# Altium footprint library SOURIAU THD.PcbLib: 34 footprints (part 2 of 5)
Each footprint in its own frame and in the unit in brackets; x right, y up, seen from the top. Pads: shape width x height; smd on the part's side, far side on the other; paste and mask are expansions set on the pad; w line width, h text height; cw(c..) or ccw(c..) is an arc to the next point about the centre after c.
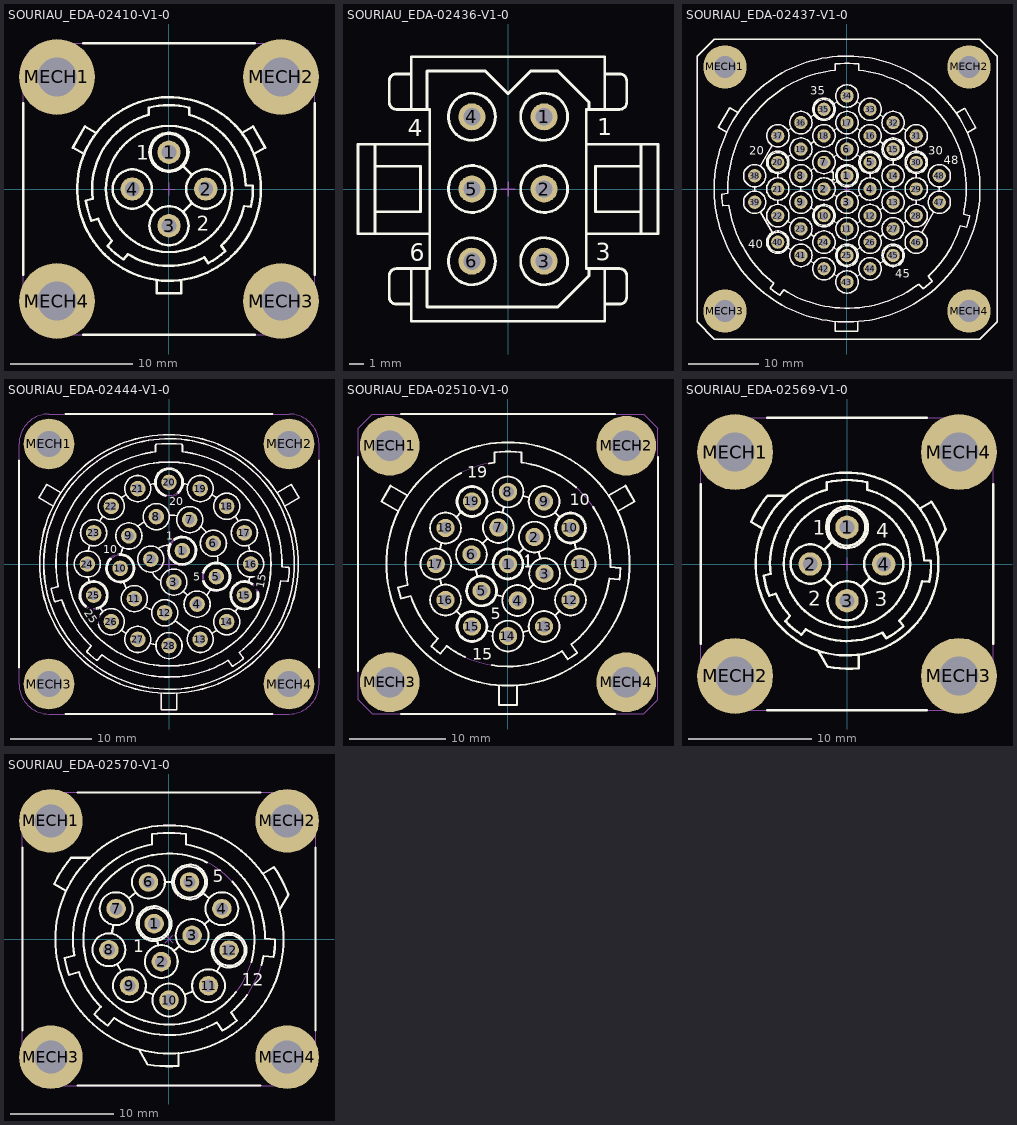
[diagram p1: the footprints below, top view; thin cyan lines are the x and y axes]

## SOURIAU_EDA-02410-V1-0 [mm] "Adapter Kit For PCB Mount For SOURIAU UTO0104P21T, 4 Poles, Shell Size 10, UT Bantam Circular Male Connector. UTO Series"
height 33.3
pads (8):
  round 1.9 hole 1.2: 1(0,3) 2(3,0) 3(0,-3) 4(-3,0)
  round 6.2 hole 3.2: MECH1(-9.15,9.15) MECH2(9.15,9.15) MECH3(9.15,-9.15) MECH4(-9.15,-9.15)
Top Overlay:
  circle w0.2: c0,3 r1.6
  circle w0.2: c0,3 r1.5
  circle w0.2: c-3,0 r1.6
  circle w0.2: c0,-3 r1.6
  circle w0.2: c3,0 r1.6
  circle w0.2: c0,0 r5.15
  circle w0.2: c0,0 r7.5
  lines w0.2: -11.9,-6.985 -11.9,6.985 ; -6.985,-11.9 6.985,-11.9 ; -6.985,11.9 6.985,11.9 ; -6.937,2.85 -7.861,3.384 -6.861,5.116 -5.937,4.583 ; -1.869,-1.131 -1.131,-1.869 ; -1,-7.433 -1,-8.5 1,-8.5 1,-7.433 ; 1.131,-1.869 1.869,-1.131 ; 1.131,1.869 1.869,1.131 ; 5.937,4.583 6.861,5.116 7.861,3.384 6.937,2.85 ; 11.9,-6.985 11.9,6.985 ; -6.785,-0.938 ccw(c0,0) -6.345,-2.58 -5.795,-2.433 ccw(c0,0) -4.654,-4.224 -5.02,-4.66 ccw(c0,0) -3.718,-5.753 -3.352,-5.317 ccw(c0,0) 2.876,-5.589 3.202,-6.055 ccw(c0,0) 4.595,-5.08 4.268,-4.614 ccw(c0,0) 6.13,-1.39 6.697,-1.439 ccw(c0,0) 6.845,0.254 6.278,0.304 ccw(c0,0) 1.65,6.065 1.65,6.648 ccw(c0,0) -1.65,6.648 -1.65,6.065 ccw(c0,0) -6.235,-0.791 -6.785,-0.938
  text "1" at -2.675,2.4 h1.2
  text "2" at 2.273,-3.412 h1.2
Mechanical 8:
  lines w0.1: -9.65,-9.15 -9.15,-9.15 ; -9.65,9.15 -9.15,9.15 ; -9.15,-9.65 -9.15,-9.15 ; -9.15,-8.65 -9.15,-9.15 ; -9.15,8.65 -9.15,9.15 ; -9.15,9.65 -9.15,9.15 ; -8.65,-9.15 -9.15,-9.15 ; -8.65,9.15 -9.15,9.15 ; -3.5,0 -3,0 ; -3,-0.5 -3,0 ; -3,0.5 -3,0 ; -2.5,0 -3,0 ; -0.5,-3 0,-3 ; -0.5,0 0,0 ; -0.5,3 0,3 ; 0,-3.5 0,-3 ; 0,-2.5 0,-3 ; 0,-0.5 0,0 ; 0,0.5 0,0 ; 0,2.5 0,3 ; 0,3.5 0,3 ; 0.5,-3 0,-3 ; 0.5,0 0,0 ; 0.5,3 0,3 ; 2.5,0 3,0 ; 3,-0.5 3,0 ; 3,0.5 3,0 ; 3.5,0 3,0 ; 8.65,-9.15 9.15,-9.15 ; 8.65,9.15 9.15,9.15 ; 9.15,-9.65 9.15,-9.15 ; 9.15,-8.65 9.15,-9.15 ; 9.15,8.65 9.15,9.15 ; 9.15,9.65 9.15,9.15 ; 9.65,-9.15 9.15,-9.15 ; 9.65,9.15 9.15,9.15
Mechanical 14:
  circle w0.1: c0,3 r1.6
  circle w0.1: c-3,0 r1.6
  circle w0.1: c0,-3 r1.6
  circle w0.1: c3,0 r1.6
  circle w0.1: c0,0 r5.15
  circle w0.1: c0,0 r7.5
  circle w0.1: c-9.15,9.15 r2.8
  circle w0.1: c9.15,9.15 r2.8
  circle w0.1: c9.15,-9.15 r2.8
  circle w0.1: c-9.15,-9.15 r2.8
  lines w0.1: -6.937,2.85 -7.861,3.384 -6.861,5.116 -5.937,4.583 ; -1.869,-1.131 -1.131,-1.869 ; -1,-7.433 -1,-8.5 1,-8.5 1,-7.433 ; 1.131,-1.869 1.869,-1.131 ; 1.131,1.869 1.869,1.131 ; 5.937,4.583 6.861,5.116 7.861,3.384 6.937,2.85 ; -11.9,-9.9 ccw(c-9.9,-9.9) -9.9,-11.9 9.9,-11.9 ccw(c9.9,-9.9) 11.9,-9.9 11.9,9.9 ccw(c9.9,9.9) 9.9,11.9 -9.9,11.9 ccw(c-9.9,9.9) -11.9,9.9 -11.9,-9.9 ; -10.312,-9.506 ccw(c-10.648,-9.15) -10.312,-8.794 cw(c-10.12,-8.59) -10.04,-8.322 ccw(c-9.899,-7.852) -9.422,-7.965 cw(c-9.15,-8.03) -8.878,-7.965 ccw(c-8.401,-7.852) -8.26,-8.322 cw(c-8.18,-8.59) -7.988,-8.794 ccw(c-7.652,-9.15) -7.988,-9.506 cw(c-8.18,-9.71) -8.26,-9.978 ccw(c-8.401,-10.448) -8.878,-10.335 cw(c-9.15,-10.27) -9.422,-10.335 ccw(c-9.899,-10.448) -10.04,-9.978 cw(c-10.12,-9.71) -10.312,-9.506 ; -10.312,8.794 ccw(c-10.648,9.15) -10.312,9.506 cw(c-10.12,9.71) -10.04,9.978 ccw(c-9.899,10.448) -9.422,10.335 cw(c-9.15,10.27) -8.878,10.335 ccw(c-8.401,10.448) -8.26,9.978 cw(c-8.18,9.71) -7.988,9.506 ccw(c-7.652,9.15) -7.988,8.794 cw(c-8.18,8.59) -8.26,8.322 ccw(c-8.401,7.852) -8.878,7.965 cw(c-9.15,8.03) -9.422,7.965 ccw(c-9.899,7.852) -10.04,8.322 cw(c-10.12,8.59) -10.312,8.794 ; -6.785,-0.938 ccw(c0,0) -6.345,-2.58 -5.795,-2.433 ccw(c0,0) -4.654,-4.224 -5.02,-4.66 ccw(c0,0) -3.718,-5.753 -3.352,-5.317 ccw(c0,0) 2.876,-5.589 3.202,-6.055 ccw(c0,0) 4.595,-5.08 4.268,-4.614 ccw(c0,0) 6.13,-1.39 6.697,-1.439 ccw(c0,0) 6.845,0.254 6.278,0.304 ccw(c0,0) 1.65,6.065 1.65,6.648 ccw(c0,0) -1.65,6.648 -1.65,6.065 ccw(c0,0) -6.235,-0.791 -6.785,-0.938 ; 7.988,-9.506 ccw(c7.652,-9.15) 7.988,-8.794 cw(c8.18,-8.59) 8.26,-8.322 ccw(c8.401,-7.852) 8.878,-7.965 cw(c9.15,-8.03) 9.422,-7.965 ccw(c9.899,-7.852) 10.04,-8.322 cw(c10.12,-8.59) 10.312,-8.794 ccw(c10.648,-9.15) 10.312,-9.506 cw(c10.12,-9.71) 10.04,-9.978 ccw(c9.899,-10.448) 9.422,-10.335 cw(c9.15,-10.27) 8.878,-10.335 ccw(c8.401,-10.448) 8.26,-9.978 cw(c8.18,-9.71) 7.988,-9.506 ; 7.988,8.794 ccw(c7.652,9.15) 7.988,9.506 cw(c8.18,9.71) 8.26,9.978 ccw(c8.401,10.448) 8.878,10.335 cw(c9.15,10.27) 9.422,10.335 ccw(c9.899,10.448) 10.04,9.978 cw(c10.12,9.71) 10.312,9.506 ccw(c10.648,9.15) 10.312,8.794 cw(c10.12,8.59) 10.04,8.322 ccw(c9.899,7.852) 9.422,7.965 cw(c9.15,8.03) 8.878,7.965 ccw(c8.401,7.852) 8.26,8.322 cw(c8.18,8.59) 7.988,8.794
  text "1" at -0.143,2.4 h1.2
  text "2" at 2.6,-0.6 h1.2
  text "3" at -0.4,-3.6 h1.2
  text "4" at -3.429,-0.6 h1.2
3D body "SOURIAU_EDA-02410-V1-0.stp": height 33.3, standoff -14.2, extent -12.25,-12.243 12.25,12.244

## SOURIAU_EDA-02436-V1-0 [mm] "SOURIAU SMS6P1 Adapter Kit For PCB Mount, 6 Poles Qikmate Male Connectors (Cable plug without strain relief hood)"
height 32.9
pads (6):
  round 1.9 hole 1.2: 1(2.54,5.08) 2(2.54,0) 3(2.54,-5.08) 4(-2.54,5.08) 5(-2.54,0) 6(-2.54,-5.08)
Top Overlay:
  circle w0.2: c-2.54,5.08 r1.65
  circle w0.2: c2.54,5.08 r1.65
  circle w0.2: c2.54,0 r1.65
  circle w0.2: c-2.54,0 r1.65
  circle w0.2: c-2.54,-5.08 r1.65
  circle w0.2: c2.54,-5.08 r1.65
  lines w0.2: -9.35,-3.15 -9.35,3.15 ; -9.35,-1.6 -7.35,-1.6 -6.15,-1.6 -6.15,1.6 -7.35,1.6 -9.35,1.6 ; -6.8,-8.1 -7.85,-8.1 cw(c-7.85,-7.6) -8.35,-7.6 -8.35,-6.1 cw(c-7.85,-6.1) -7.85,-5.6 -5.5,-5.6 -5.5,5.6 -7.85,5.6 cw(c-7.85,6.1) -8.35,6.1 -8.35,7.6 cw(c-7.85,7.6) -7.85,8.1 -6.8,8.1 ; -6.8,-5.6 -6.8,-9.3 6.8,-9.3 6.8,-5.6 ; -6.8,5.6 -6.8,9.3 6.8,9.3 6.8,5.6 ; -5.7,-5.6 -5.7,-8.3 3.5,-8.3 5.7,-6.1 5.7,-5.6 ; -5.7,5.6 -5.7,8.3 -1.6,8.3 0,6.7 1.6,8.3 3.5,8.3 5.7,6.1 5.7,5.6 ; -5.5,-3.15 -10.55,-3.15 -10.55,3.15 -5.5,3.15 ; 5.5,-3.15 10.55,-3.15 10.55,3.15 5.5,3.15 ; 6.8,-8.1 7.85,-8.1 ccw(c7.85,-7.6) 8.35,-7.6 8.35,-6.1 ccw(c7.85,-6.1) 7.85,-5.6 5.5,-5.6 5.5,5.6 7.85,5.6 ccw(c7.85,6.1) 8.35,6.1 8.35,7.6 ccw(c7.85,7.6) 7.85,8.1 6.8,8.1 ; 7.351,1.6 6.15,1.6 6.15,-1.6 9.35,-1.6 ; 7.357,1.6 9.35,1.6 ; 9.35,-3.15 9.35,3.15
  text "3" at 6.182,-4.999 h1.2
  text "6" at -6.909,-5.043 h1.2
  text "1" at 6.289,3.778 h1.2
  text "4" at -7.039,3.693 h1.2
Mechanical 8:
  lines w0.1: -3.04,-5.08 -2.54,-5.08 ; -3.04,0 -2.54,0 ; -3.04,5.08 -2.54,5.08 ; -2.54,-5.58 -2.54,-5.08 ; -2.54,-4.58 -2.54,-5.08 ; -2.54,-0.5 -2.54,0 ; -2.54,0.5 -2.54,0 ; -2.54,4.58 -2.54,5.08 ; -2.54,5.58 -2.54,5.08 ; -2.04,-5.08 -2.54,-5.08 ; -2.04,0 -2.54,0 ; -2.04,5.08 -2.54,5.08 ; -0.5,0 0,0 ; 0,-0.5 0,0 ; 0,0.5 0,0 ; 0.5,0 0,0 ; 2.04,-5.08 2.54,-5.08 ; 2.04,0 2.54,0 ; 2.04,5.08 2.54,5.08 ; 2.54,-5.58 2.54,-5.08 ; 2.54,-4.58 2.54,-5.08 ; 2.54,-0.5 2.54,0 ; 2.54,0.5 2.54,0 ; 2.54,4.58 2.54,5.08 ; 2.54,5.58 2.54,5.08 ; 3.04,-5.08 2.54,-5.08 ; 3.04,0 2.54,0 ; 3.04,5.08 2.54,5.08
Mechanical 14:
  circle w0.1: c-2.54,5.08 r1.65
  circle w0.1: c2.54,5.08 r1.65
  circle w0.1: c2.54,0 r1.65
  circle w0.1: c-2.54,0 r1.65
  circle w0.1: c-2.54,-5.08 r1.65
  circle w0.1: c2.54,-5.08 r1.65
  lines w0.1: -9.35,-3.15 -9.35,3.15 ; -9.35,-1.6 -7.35,-1.6 -6.15,-1.6 -6.15,1.6 -7.35,1.6 -9.35,1.6 ; -6.8,-8.1 -7.85,-8.1 cw(c-7.85,-7.6) -8.35,-7.6 -8.35,-6.1 cw(c-7.85,-6.1) -7.85,-5.6 -5.5,-5.6 -5.5,5.6 -7.85,5.6 cw(c-7.85,6.1) -8.35,6.1 -8.35,7.6 cw(c-7.85,7.6) -7.85,8.1 -6.8,8.1 ; -6.8,-5.6 -6.8,-9.3 6.8,-9.3 6.8,-5.6 ; -6.8,5.6 -6.8,9.3 6.8,9.3 6.8,5.6 ; -5.7,-5.6 -5.7,-8.3 3.5,-8.3 5.7,-6.1 5.7,-5.6 ; -5.7,5.6 -5.7,8.3 -1.6,8.3 0,6.7 1.6,8.3 3.5,8.3 5.7,6.1 5.7,5.6 ; -5.5,-3.15 -10.55,-3.15 -10.55,3.15 -5.5,3.15 ; 5.5,-3.15 10.55,-3.15 10.55,3.15 5.5,3.15 ; 6.8,-8.1 7.85,-8.1 ccw(c7.85,-7.6) 8.35,-7.6 8.35,-6.1 ccw(c7.85,-6.1) 7.85,-5.6 5.5,-5.6 5.5,5.6 7.85,5.6 ccw(c7.85,6.1) 8.35,6.1 8.35,7.6 ccw(c7.85,7.6) 7.85,8.1 6.8,8.1 ; 7.351,1.6 6.15,1.6 6.15,-1.6 9.35,-1.6 ; 7.357,1.6 9.35,1.6 ; 9.35,-3.15 9.35,3.15
  text "1" at 2.397,4.48 h1.2
  text "4" at -2.969,4.48 h1.2
  text "5" at -2.94,-0.6 h1.2
  text "2" at 2.14,-0.6 h1.2
  text "6" at -2.911,-5.68 h1.2
3D body "SOURIAU_EDA-02436-V1-0.stp": height 33.2, standoff -13, extent -10.55,-9.3 10.55,9.3

## SOURIAU_EDA-02437-V1-0 [mm] "Adapter Kit For PCB Mount For SOURIAU UTO02448P21T, 48 Poles, Shell Size 24, UT Bantam Circular Female Connector. UTO Series"
height 38.1
pads (52):
  round 1.9 hole 1.2: 1(0,1.9) 2(-3.3,0) 3(0,-1.9) 4(3.3,0) 5(3.3,3.8) 6(0,5.7) 7(-3.3,3.8) 8(-6.6,1.883) 9(-6.6,-1.9) 10(-3.3,-3.8) 11(0,-5.7) 12(3.3,-3.8) 13(6.6,-1.9) 14(6.6,1.9) 15(6.6,5.7) 16(3.3,7.6) 17(0,9.5) 18(-3.3,7.6) 19(-6.6,5.7) 20(-9.9,3.8) 21(-9.9,0) 22(-9.9,-3.8) 23(-6.6,-5.7) 24(-3.3,-7.6) 25(0,-9.5) 26(3.3,-7.6) 27(6.6,-5.7) 28(9.9,-3.8) 29(9.9,0) 30(9.9,3.8) 31(9.9,7.6) 32(6.6,9.5) 33(3.3,11.4) 34(0,13.3) 35(-3.3,11.4) 36(-6.6,9.5) 37(-9.9,7.6) 38(-13.2,1.9) 39(-13.2,-1.9) 40(-9.9,-7.6) 41(-6.6,-9.5) 42(-3.3,-11.4) 43(0,-13.3) 44(3.3,-11.4) 45(6.6,-9.5) 46(9.9,-7.617) 47(13.2,-1.9) 48(13.2,1.9)
  round 6.2 hole 3.2: MECH1(-17.45,17.45) MECH2(17.45,17.45) MECH3(-17.45,-17.45) MECH4(17.45,-17.45)
Top Overlay:
  circle w0.2: c0,0 r19.015
  circle w0.2: c9.9,3.8 r1.6
  circle w0.2: c0,1.9 r1.6
  circle w0.2: c-9.9,3.8 r1.6
  circle w0.2: c6.6,-9.5 r1.6
  circle w0.2: c-9.9,3.8 r1.4
  circle w0.2: c0,1.9 r1.4
  circle w0.2: c9.9,3.8 r1.4
  circle w0.2: c6.6,-9.5 r1.4
  circle w0.2: c0,5.7 r1.6
  circle w0.2: c3.3,0 r1.6
  circle w0.2: c0,-1.9 r1.6
  circle w0.2: c-3.3,0 r1.6
  circle w0.2: c-6.6,1.883 r1.6
  circle w0.2: c-6.6,-1.9 r1.6
  circle w0.2: c0,-5.7 r1.6
  circle w0.2: c6.6,-1.9 r1.6
  circle w0.2: c9.9,7.6 r1.6
  circle w0.2: c6.6,9.5 r1.6
  circle w0.2: c0,13.3 r1.6
  circle w0.2: c-6.6,9.5 r1.6
  circle w0.2: c-9.891,7.616 r1.6
  circle w0.2: c-13.2,-1.9 r1.6
  circle w0.2: c6.6,-9.5 r1.6
  circle w0.2: c-3.3,-11.4 r1.6
  circle w0.2: c0,-13.3 r1.6
  circle w0.2: c3.3,-11.4 r1.6
  circle w0.2: c3.3,-7.6 r1.6
  circle w0.2: c6.6,-5.7 r1.6
  circle w0.2: c9.9,-3.8 r1.6
  circle w0.2: c13.2,-1.9 r1.6
  circle w0.2: c9.9,0 r1.6
  circle w0.2: c6.6,1.9 r1.6
  circle w0.2: c13.2,1.9 r1.6
  circle w0.2: c9.9,7.6 r1.6
  circle w0.2: c-3.3,7.6 r1.6
  circle w0.2: c0,9.5 r1.6
  circle w0.2: c3.3,7.6 r1.6
  circle w0.2: c-6.6,-5.7 r1.6
  circle w0.2: c-3.3,-7.6 r1.6
  circle w0.2: c-9.9,-3.8 r1.6
  circle w0.2: c-9.9,0 r1.6
  circle w0.2: c-3.3,3.8 r1.6
  circle w0.2: c3.3,3.8 r1.6
  circle w0.2: c3.3,3.8 r1.4
  circle w0.2: c-3.3,-3.8 r1.6
  circle w0.2: c-3.3,-3.8 r1.4
  circle w0.2: c9.9,-7.617 r1.6
  circle w0.2: c6.6,5.7 r1.6
  circle w0.2: c6.6,5.7 r1.4
  circle w0.2: c-6.6,5.7 r1.6
  circle w0.2: c-13.2,1.9 r1.6
  circle w0.2: c-9.9,-7.6 r1.6
  circle w0.2: c-9.9,-7.6 r1.4
  circle w0.2: c-9.9,-7.6 r1.6
  circle w0.2: c-6.6,-9.5 r1.6
  circle w0.2: c3.3,-3.8 r1.6
  circle w0.2: c0,-9.5 r1.6
  circle w0.2: c0,-9.5 r1.4
  circle w0.2: c0,-9.5 r1.6
  circle w0.2: c3.3,11.4 r1.6
  circle w0.2: c-3.3,11.4 r1.6
  circle w0.2: c-3.3,11.4 r1.4
  lines w0.2: -17.187,8.134 -18.394,8.831 -16.794,11.602 -15.58,10.901 ; -13.2,-0.3 -13.2,0.3 ; -12.398,-3.285 -10.702,-6.215 ; -12.398,3.285 -10.693,6.231 ; -9.9,-2.2 -9.9,-1.6 ; -9.9,1.6 -9.9,2.2 ; -8.513,-8.398 -7.987,-8.702 ; -8.513,-4.598 -7.987,-4.902 ; -8.513,4.598 -7.987,4.902 ; -8.5,8.406 -7.987,8.702 ; -6.6,-0.3 -6.6,0.283 ; -5.216,2.687 -4.684,2.996 ; -5.213,-10.298 -4.687,-10.602 ; -5.213,-6.498 -4.687,-6.802 ; -5.213,-2.698 -4.687,-3.002 ; -5.213,6.498 -4.687,6.802 ; -5.213,10.298 -4.687,10.602 ; -2.177,1.3 -1.775,1.3 ; -2.177,2.3 -1.975,2.5 -1.975,1.3 ; -1.913,-12.198 -1.387,-12.502 ; -1.913,-8.398 -1.387,-8.702 ; -1.913,-4.598 -1.387,-4.902 ; -1.913,-0.798 -1.387,-1.102 ; -1.913,0.798 -1.387,1.102 ; -1.913,4.598 -1.387,4.902 ; -1.913,8.398 -1.387,8.702 ; -1.913,12.198 -1.387,12.502 ; -1.651,-18.943 -1.651,-20.345 1.549,-20.345 1.549,-18.952 ; 1.387,-12.502 1.913,-12.198 ; 1.387,-8.702 1.913,-8.398 ; 1.387,-4.902 1.913,-4.598 ; 1.387,-1.102 1.913,-0.798 ; 1.387,4.902 1.913,4.598 ; 1.387,8.702 1.913,8.398 ; 1.387,12.502 1.913,12.198 ; 3.3,1.6 3.3,2.2 ; 4.687,-10.602 5.213,-10.298 ; 4.687,-6.802 5.213,-6.498 ; 4.687,-3.002 5.213,-2.698 ; 4.687,6.802 5.213,6.498 ; 4.687,10.602 5.213,10.298 ; 6.6,-0.3 6.6,0.3 ; 6.6,3.5 6.6,4.1 ; 7.987,-4.902 8.513,-4.598 ; 7.987,8.702 8.513,8.398 ; 7.99,-8.707 8.51,-8.41 ; 9.9,-2.2 9.9,-1.6 ; 9.9,1.6 9.9,2.2 ; 9.9,5.4 9.9,6 ; 10.7,-6.231 12.4,-3.286 ; 13.2,-0.3 13.2,0.3 ; 15.638,10.818 16.845,11.514 18.445,8.743 17.231,8.042 ; -21.45,-18.95 -18.95,-21.45 18.95,-21.45 21.45,-18.95 21.45,18.95 18.95,21.45 -18.95,21.45 -21.45,18.95 -21.45,-18.95 ; -17.946,-0.719 ccw(c0,0) -17.798,-2.41 -16.885,-2.33 ccw(c0,0) -10.461,-13.458 -10.986,-14.208 ccw(c0,0) -9.594,-15.183 -9.068,-14.433 ccw(c0,0) 10.292,-13.587 10.88,-14.289 ccw(c0,0) 12.183,-13.196 11.594,-12.495 ccw(c0,0) 16.224,-5.227 17.109,-5.464 ccw(c0,0) 17.549,-3.822 16.664,-3.585 ccw(c0,0) 1.65,16.965 1.65,17.884 ccw(c0,0) -1.65,17.884 -1.65,16.965 ccw(c0,0) -17.033,-0.637 -17.946,-0.719
  text "48" at 13.86,3.53 h1.2
  text "20" at -14.002,4.91 h1.2
  text "35" at -5.23,13.5 h1.2
  text "40" at -14.128,-8.447 h1.2
  text "45" at 6.871,-12.664 h1.2
  text "30" at 11.604,4.928 h1.2
Mechanical 8:
  drawing of 428 lines, arcs and shapes, not listed
Mechanical 14:
  drawing of 185 lines, arcs and shapes, not listed
  text "48" at 12.229,1.3 h1.2
  text "30" at 8.929,3.2 h1.2
  text "1" at -0.143,1.3 h1.2
  text "5" at 2.9,3.2 h1.2
  text "10" at -4.157,-4.4 h1.2
  text "15" at 5.743,5.1 h1.2
  text "20" at -10.871,3.2 h1.2
  text "25" at -0.971,-10.1 h1.2
  text "35" at -4.271,10.8 h1.2
  text "40" at -10.871,-8.2 h1.2
  text "45" at 5.629,-10.1 h1.2
3D body "SOURIAU_EDA-02437-V1-0.stp": height 37.7, standoff -5.89, extent -21.45,-21.45 21.45,21.45

## SOURIAU_EDA-02444-V1-0 [mm] "Adapter Kit For PCB Mount For SOURIAU UTG02028S03, 28 Poles, Shell Size 20, Metalok Bantam Circular Female Connecteur"
height 37.35
pads (32):
  round 1.9 hole 1.2: 1(1.626,1.626) 2(-2.222,0.595) 3(0.595,-2.222) 4(3.441,-4.915) 5(5.796,-1.553) 6(5.438,2.536) 7(2.536,5.438) 8(-1.553,5.796) 9(-4.915,3.441) 10(-5.977,-0.523) 11(-4.243,-4.243) 12(-0.523,-5.977) 13(3.827,-9.239) 14(7.071,-7.071) 15(9.239,-3.827) 16(10,0) 17(9.239,3.827) 18(7.071,7.071) 19(3.827,9.239) 20(0,10) 21(-3.827,9.239) 22(-7.071,7.071) 23(-9.239,3.827) 24(-10,0) 25(-9.239,-3.827) 26(-7.071,-7.071) 27(-3.827,-9.239) 28(0,-10)
  round 6.2 hole 3.2: MECH1(-14.7,14.7) MECH2(14.7,14.7) MECH3(-14.7,-14.7) MECH4(14.7,-14.7)
Top Overlay:
  circle w0.2: c0,0 r15.85
  circle w0.2: c0,0 r15.35
  circle w0.2: c0,0 r12.5
  circle w0.2: c9.239,3.827 r1.6
  circle w0.2: c7.071,7.071 r1.6
  circle w0.2: c3.827,9.239 r1.6
  circle w0.2: c-3.827,9.239 r1.6
  circle w0.2: c-7.071,7.071 r1.6
  circle w0.2: c-9.239,3.827 r1.6
  circle w0.2: c-10,0 r1.6
  circle w0.2: c-3.827,-9.239 r1.6
  circle w0.2: c0,-10 r1.6
  circle w0.2: c3.827,-9.239 r1.6
  circle w0.2: c7.071,-7.071 r1.6
  circle w0.2: c-4.243,-4.243 r1.6
  circle w0.2: c-2.222,0.595 r1.6
  circle w0.2: c0.595,-2.222 r1.6
  circle w0.2: c-0.523,-5.977 r1.6
  circle w0.2: c3.441,-4.915 r1.6
  circle w0.2: c5.438,2.536 r1.6
  circle w0.2: c2.536,5.438 r1.6
  circle w0.2: c-1.553,5.796 r1.6
  circle w0.2: c-4.915,3.441 r1.6
  lines w0.2: -18.375,-12.7 -18.375,12.7 ; -14.175,7.093 -15.931,8.107 -14.986,9.743 -13.23,8.729 ; -12.7,-18.375 12.7,-18.375 ; -12.7,18.375 12.7,18.375 ; -10.238,-5.264 cw(c-9.239,-3.827) -8.844,-5.532 ; -10.152,-5.14 cw(c-9.239,-3.827) -8.878,-5.386 ; -9.872,-1.595 ccw(c0,0) -9.731,-2.304 ; -9.872,1.595 cw(c0,0) -9.731,2.304 ; -8.643,-7.367 ccw(c-7.071,-7.071) -8.414,-6.202 ; -8.51,-5.251 ccw(c0,0) -8.108,-5.853 ; -8.51,5.251 cw(c0,0) -8.108,5.853 ; -7.203,0.726 ccw(c-5.977,-0.523) -6.069,1.225 ; -7.098,0.619 ccw(c-5.977,-0.523) -6.061,1.075 ; -5.903,1.075 cw(c0,0) -5.65,2.02 ; -5.853,-8.108 ccw(c0,0) -5.251,-8.51 ; -5.853,8.108 cw(c0,0) -5.251,8.51 ; -5.626,-2.084 ccw(c0,0) -5.213,-2.971 ; -3.831,4.618 cw(c0,0) -3.029,5.179 ; -2.971,-5.213 ccw(c0,0) -2.084,-5.626 ; -2.304,-9.731 ccw(c0,0) -1.595,-9.872 ; -2.304,9.731 cw(c0,0) -1.595,9.872 ; -2.072,-0.998 ccw(c0,0) -0.998,-2.072 ; -1.296,1.9 cw(c0,0) 0.172,2.294 ; -0.945,-15.822 -0.945,-17.85 0.945,-17.85 0.945,-15.822 ; -0.395,8.295 cw(c0,10) 1.16,8.689 ; -0.361,8.441 cw(c0,10) 1.06,8.802 ; 0.034,6 cw(c0,0) 1.008,5.915 ; 0.115,2.508 ccw(c1.626,1.626) 0.567,3.019 ; 0.244,2.433 ccw(c1.626,1.626) 0.658,2.9 ; 0.757,-6.937 2.547,-8.279 ; 1.595,9.872 cw(c0,0) 2.304,9.731 ; 1.757,-3.321 2.279,-3.815 ; 3.883,4.574 cw(c0,0) 4.574,3.883 ; 4.111,-1.08 cw(c5.796,-1.553) 4.13,-2.09 ; 4.255,-1.121 cw(c5.796,-1.553) 4.273,-2.044 ; 4.618,-3.831 ccw(c0,0) 5.179,-3.029 ; 5.251,-8.51 ccw(c0,0) 5.853,-8.108 ; 5.251,8.51 cw(c0,0) 5.853,8.108 ; 5.915,1.008 cw(c0,0) 6,0.034 ; 8.108,-5.853 ccw(c0,0) 8.51,-5.251 ; 8.108,5.853 cw(c0,0) 8.51,5.251 ; 9.731,-2.304 ccw(c0,0) 9.872,-1.595 ; 9.731,2.304 cw(c0,0) 9.872,1.595 ; 10.168,-2.525 ccw(c9.239,-3.827) 10.789,-3.429 ; 10.255,-2.402 ccw(c9.239,-3.827) 10.934,-3.392 ; 10.407,-1.547 cw(c10,0) 11.118,-1.144 ; 13.23,8.729 14.986,9.743 15.931,8.107 14.175,7.093 ; 18.375,-12.7 18.375,12.7 ; -14.414,-3.13 ccw(c0,0) -14.048,-4.496 ccw(c-13.905,-4.451) -13.866,-4.595 -13.133,-4.399 ccw(c0,0) -9.537,-10.043 -10.025,-10.625 ccw(c-9.91,-10.721) -10.012,-10.832 ccw(c0,0) -8.928,-11.741 ccw(c-8.838,-11.621) -8.723,-11.718 -8.235,-11.136 ccw(c0,0) 7.233,-11.811 7.668,-12.433 ccw(c7.791,-12.347) 7.871,-12.474 ccw(c0,0) 9.03,-11.663 ccw(c8.938,-11.544) 9.061,-11.458 8.625,-10.836 ccw(c0,0) 13.697,-2.052 14.454,-2.118 ccw(c14.467,-1.968) 14.615,-1.989 ccw(c0,0) 14.739,-0.58 ccw(c14.589,-0.574) 14.602,-0.424 13.845,-0.358 ccw(c0,0) 1.65,13.751 1.65,14.523 ccw(c1.5,14.523) 1.515,14.672 ccw(c0,0) -1.515,14.672 ccw(c-1.5,14.523) -1.65,14.523 -1.65,13.751 ccw(c0,0) -13.573,-2.757 -14.306,-2.953 ccw(c-14.267,-3.098) -14.414,-3.13
  text "1" at -0.331,2.965 h1
  text "5" at 2.962,-2.053 h1
  text "10" at -8.041,1.315 h1
  text "15" at 11.634,-3.04 h1
  text "20" at 0,7.2 h1
  text "25" at -10.429,-5.998 h1
Mechanical 8:
  circle w0.1: c-14.7,14.7 r1.6
  circle w0.1: c14.7,14.7 r1.6
  circle w0.1: c14.7,-14.7 r1.6
  circle w0.1: c-14.7,-14.7 r1.6
  lines w0.1: -15.2,-14.7 -14.7,-14.7 ; -15.2,14.7 -14.7,14.7 ; -14.7,-15.2 -14.7,-14.7 ; -14.7,-14.2 -14.7,-14.7 ; -14.7,14.2 -14.7,14.7 ; -14.7,15.2 -14.7,14.7 ; -14.2,-14.7 -14.7,-14.7 ; -14.2,14.7 -14.7,14.7 ; -10.5,0 -10,0 ; -10,-0.5 -10,0 ; -10,0.5 -10,0 ; -9.739,-3.827 -9.239,-3.827 ; -9.739,3.827 -9.239,3.827 ; -9.5,0 -10,0 ; -9.239,-4.327 -9.239,-3.827 ; -9.239,-3.327 -9.239,-3.827 ; -9.239,3.327 -9.239,3.827 ; -9.239,4.327 -9.239,3.827 ; -8.739,-3.827 -9.239,-3.827 ; -8.739,3.827 -9.239,3.827 ; -7.571,-7.071 -7.071,-7.071 ; -7.571,7.071 -7.071,7.071 ; -7.071,-7.571 -7.071,-7.071 ; -7.071,-6.571 -7.071,-7.071 ; -7.071,6.571 -7.071,7.071 ; -7.071,7.571 -7.071,7.071 ; -6.571,-7.071 -7.071,-7.071 ; -6.571,7.071 -7.071,7.071 ; -6.477,-0.523 -5.977,-0.523 ; -5.977,-1.023 -5.977,-0.523 ; -5.977,-0.023 -5.977,-0.523 ; -5.477,-0.523 -5.977,-0.523 ; -5.415,3.441 -4.915,3.441 ; -4.915,2.941 -4.915,3.441 ; -4.915,3.941 -4.915,3.441 ; -4.743,-4.243 -4.243,-4.243 ; -4.415,3.441 -4.915,3.441 ; -4.327,-9.239 -3.827,-9.239 ; -4.327,9.239 -3.827,9.239 ; -4.243,-4.743 -4.243,-4.243 ; -4.243,-3.743 -4.243,-4.243 ; -3.827,-9.739 -3.827,-9.239 ; -3.827,-8.739 -3.827,-9.239 ; -3.827,8.739 -3.827,9.239 ; -3.827,9.739 -3.827,9.239 ; -3.743,-4.243 -4.243,-4.243 ; -3.327,-9.239 -3.827,-9.239 ; -3.327,9.239 -3.827,9.239 ; -2.722,0.595 -2.222,0.595 ; -2.222,0.095 -2.222,0.595 ; -2.222,1.095 -2.222,0.595 ; -2.053,5.796 -1.553,5.796 ; -1.722,0.595 -2.222,0.595 ; -1.553,5.296 -1.553,5.796 ; -1.553,6.296 -1.553,5.796 ; -1.053,5.796 -1.553,5.796 ; -1.023,-5.977 -0.523,-5.977 ; -1,0 0,0 ; -0.523,-6.477 -0.523,-5.977 ; -0.523,-5.477 -0.523,-5.977 ; -0.5,-10 0,-10 ; -0.5,10 0,10 ; -0.023,-5.977 -0.523,-5.977 ; 0,-10.5 0,-10 ; 0,-9.5 0,-10 ; 0,-1 0,0 ; 0,1 0,0 ; 0,9.5 0,10 ; 0,10.5 0,10 ; 0.095,-2.222 0.595,-2.222 ; 0.5,-10 0,-10 ; 0.5,10 0,10 ; 0.595,-2.722 0.595,-2.222 ; 0.595,-1.722 0.595,-2.222 ; 1,0 0,0 ; 1.095,-2.222 0.595,-2.222 ; 1.126,1.626 1.626,1.626 ; 1.626,1.126 1.626,1.626 ; 1.626,2.126 1.626,1.626 ; 2.036,5.438 2.536,5.438 ; 2.126,1.626 1.626,1.626 ; 2.536,4.938 2.536,5.438 ; 2.536,5.938 2.536,5.438 ; 2.941,-4.915 3.441,-4.915 ; 3.036,5.438 2.536,5.438 ; 3.327,-9.239 3.827,-9.239 ; 3.327,9.239 3.827,9.239 ; 3.441,-5.415 3.441,-4.915 ; 3.441,-4.415 3.441,-4.915 ; 3.827,-9.739 3.827,-9.239 ; 3.827,-8.739 3.827,-9.239 ; 3.827,8.739 3.827,9.239 ; 3.827,9.739 3.827,9.239 ; 3.941,-4.915 3.441,-4.915 ; 4.327,-9.239 3.827,-9.239 ; 4.327,9.239 3.827,9.239 ; 4.938,2.536 5.438,2.536 ; 5.296,-1.553 5.796,-1.553 ; 5.438,2.036 5.438,2.536 ; 5.438,3.036 5.438,2.536 ; 5.796,-2.053 5.796,-1.553 ; 5.796,-1.053 5.796,-1.553 ; 5.938,2.536 5.438,2.536 ; 6.296,-1.553 5.796,-1.553 ; 6.571,-7.071 7.071,-7.071 ; 6.571,7.071 7.071,7.071 ; 7.071,-7.571 7.071,-7.071 ; 7.071,-6.571 7.071,-7.071 ; 7.071,6.571 7.071,7.071 ; 7.071,7.571 7.071,7.071 ; 7.571,-7.071 7.071,-7.071 ; 7.571,7.071 7.071,7.071 ; 8.739,-3.827 9.239,-3.827 ; 8.739,3.827 9.239,3.827 ; 9.239,-4.327 9.239,-3.827 ; 9.239,-3.327 9.239,-3.827 ; 9.239,3.327 9.239,3.827 ; 9.239,4.327 9.239,3.827 ; 9.5,0 10,0 ; 9.739,-3.827 9.239,-3.827 ; 9.739,3.827 9.239,3.827 ; 10,-0.5 10,0 ; 10,0.5 10,0 ; 10.5,0 10,0 ; 14.2,-14.7 14.7,-14.7 ; 14.2,14.7 14.7,14.7 ; 14.7,-15.2 14.7,-14.7 ; 14.7,-14.2 14.7,-14.7 ; 14.7,14.2 14.7,14.7 ; 14.7,15.2 14.7,14.7 ; 15.2,-14.7 14.7,-14.7 ; 15.2,14.7 14.7,14.7